# Altium schematic symbol library 13-Logicold 逻辑 IC.SchLib: 297 symbols (part 5 of 30) (continued)
## ATMEGA128A-MU
designator IC?
8-bit AVR Microcontroller, 2.7-5.5V, 16MHz, 128KB Flash, 4KB EEPROM, 4KB SRAM, 64-pin MLF, Industrial Grade (-40°C to 85°C)
pins: 1 ~{PEN} (in), 2 PE0 RXD0/(PDI) (io), 3 PE1 (TXD0/PDO) (io), 4 PE2 (XCK0/AIN0) (io), 5 PE3 (OC3A/AIN1) (io), 6 PE4 (OC3B/INT4) (io), 7 PE5 (OC3C/INT5) (io), 8 PE6 (T3/INT6) (io), 9 PE7 (ICP3/INT7) (io), 10 PB0 (~{SS}) (io), 11 PB1 (SCK) (io), 12 PB2 (MOSI) (io), 13 PB3 (MISO) (io), 14 PB4 (OC0) (io), 15 PB5 (OC1A) (io), 16 PB6 (OC1B) (io), 17 PB7 (OC2/OC1C) (io), 18 PG3/TOSC2 (io), 19 PG4/TOSC1 (io), 20 ~{RESET} (in), 21 VCC (power), 22 GND (power), 23 XTAL2 (out), 24 XTAL1 (in), 25 PD0 (SCL/INT0) (io), 26 PD1 (SDA/INT1) (io), 27 PD2 (RXD1/INT2) (io), 28 PD3 (TXD1/INT3) (io), 29 PD4 (ICP1) (io), 30 PD5 (XCK1) (io), 31 PD6 (T1) (io), 32 PD7 (T2) (io), 33 PG0 (~{WR}) (io), 34 PG1 (~{RD}) (io), 35 PC0 (A8) (io), 36 PC1 (A9) (io), 37 PC2 (A10 (io), 38 PC3 (A11) (io), 39 PC4 (A12) (io), 40 PC5 (A13) (io), 41 PC6 (A14) (io), 42 PC7 (A15) (io), 43 PG2 (ALE) (io), 44 PA7 (AD7) (io), 45 PA6 (AD6) (io), 46 PA5 (AD5) (io), 47 PA4 (AD4) (io), 48 PA3 (AD3) (io), 49 PA2 (AD2) (io), 50 PA1 (AD1) (io), 51 PA0 (AD0) (io), 52 VCC (power), 53 GND (power), 54 PF7 (ADC7/TDI) (io), 55 PF6 (ADC6/TDO) (io), 56 PF5 (ADC5/TMS) (io), 57 PF4 (ADC4/TCK) (io), 58 PF3 (ADC3) (io), 59 PF2 (ADC2) (io), 60 PF1 (ADC1) (io), 61 PF0 (ADC0) (io), 62 AREF (power), 63 GND (power), 64 AVCC (power), 65 EP

## ATMEGA328P-MU
designator IC?
8-bit AVR 20MHz Microcontroller With 32K Bytes In-System  Programmable  Flash
pins: 1 PD3 (PCINT19/OC2B/INT1) (io), 2 PD4 (PCINT20/XCK/T0) (io), 3 GND (power), 4 VCC (power), 5 GND (power), 6 VCC (power), 7 PB6 (PCINT6/XTAL1/TOSC1) (io), 8 PB7 (PCINT7/XTAL2/TOSC2) (io), 9 PD5 (PCINT21/OC0B/T1) (io), 10 PD6 (PCINT22/OC0A/AIN0) (io), 11 PD7 (PCINT23/AIN1) (io), 12 PB0 (PCINT0/CLKO/ICP1) (io), 13 PB1 (PCINT1/OC1A) (io), 14 PB2 (PCINT2/SS/OC1B) (io), 15 PB3 (PCINT3/OC2A/MOSI) (io), 16 PB4 (PCINT4/MISO) (io), 17 PB5 (SCK/PCINT5) (io), 18 AVCC (power), 19 ADC6 (io), 20 AREF (in), 21 GND (power), 22 ADC7 (io), 23 PC0 (ADC0/PCINT8) (io), 24 PC1 (ADC1/PCINT9) (io), 25 PC2 (ADC2/PCINT10) (io), 26 PC3 (ADC3/PCINT11) (io), 27 PC4 (ADC4/SDA/PCINT12) (io), 28 PC5 (ADC5/SCL/PCINT13) (io), 29 PC6 (RESET/PCINT14) (io), 30 PD0 (RXD/PCINT16) (io), 31 PD1 (TXD/PCINT17) (io), 32 PD2 (INT0/PCINT18) (io), 33 EP (power)

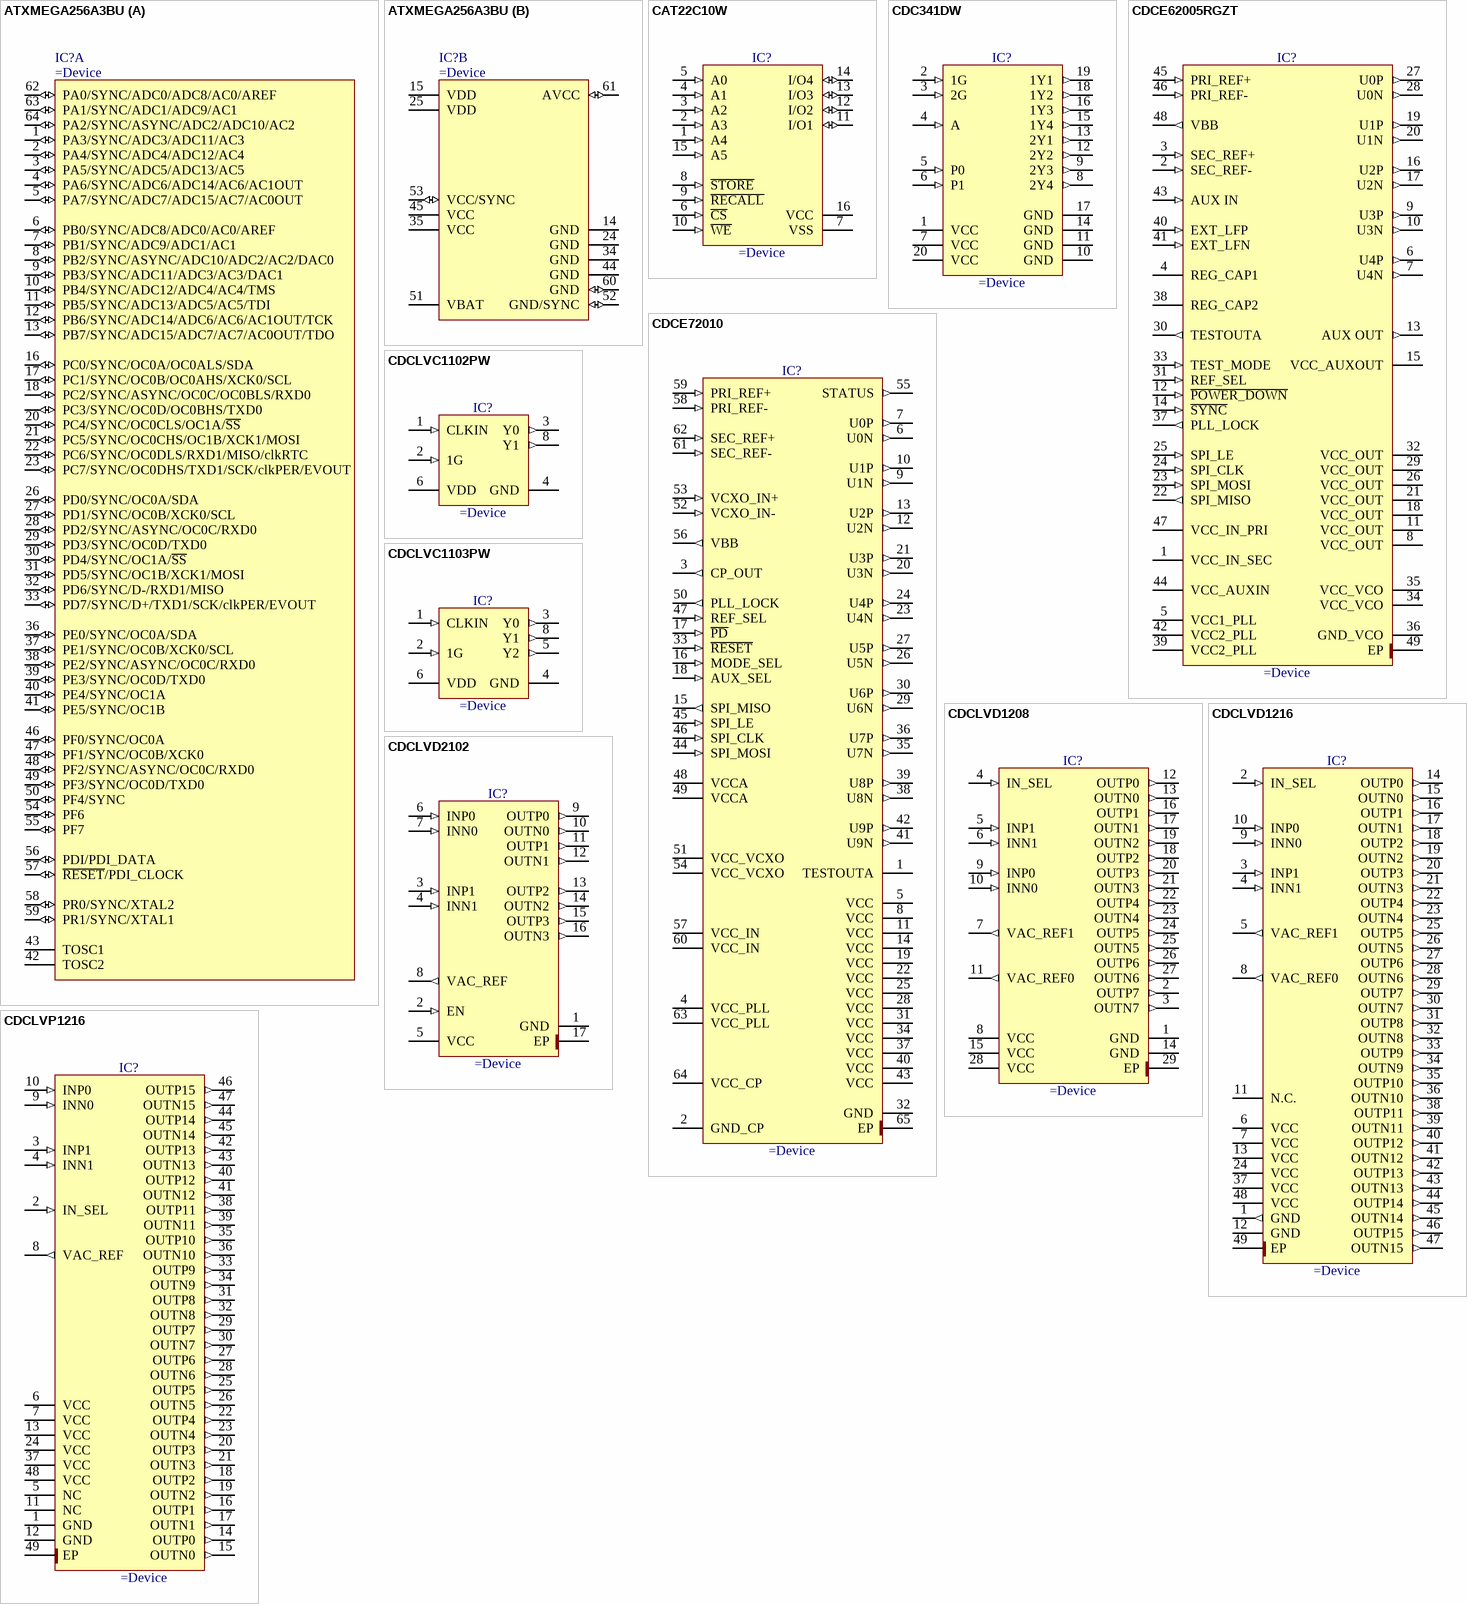
[diagram p30: symbols ATXMEGA256A3BU to CDCLVP1216]

## ATXMEGA256A3BU
designator IC?
8/16-bit XMEGA A3BU 32MHz Microcontroller With 256KBytes of in-System Self-Programmable Flash
part A pins: 1 PA3/SYNC/ADC3/ADC11/AC3 (io), 2 PA4/SYNC/ADC4/ADC12/AC4 (io), 3 PA5/SYNC/ADC5/ADC13/AC5 (io), 4 PA6/SYNC/ADC6/ADC14/AC6/AC1OUT (io), 5 PA7/SYNC/ADC7/ADC15/AC7/AC0OUT (io), 6 PB0/SYNC/ADC8/ADC0/AC0/AREF (io), 7 PB1/SYNC/ADC9/ADC1/AC1 (io), 8 PB2/SYNC/ASYNC/ADC10/ADC2/AC2/DAC0 (io), 9 PB3/SYNC/ADC11/ADC3/AC3/DAC1 (io), 10 PB4/SYNC/ADC12/ADC4/AC4/TMS (io), 11 PB5/SYNC/ADC13/ADC5/AC5/TDI (io), 12 PB6/SYNC/ADC14/ADC6/AC6/AC1OUT/TCK (io), 13 PB7/SYNC/ADC15/ADC7/AC7/AC0OUT/TDO (io), 16 PC0/SYNC/OC0A/OC0ALS/SDA (io), 17 PC1/SYNC/OC0B/OC0AHS/XCK0/SCL (io), 18 PC2/SYNC/ASYNC/OC0C/OC0BLS/RXD0 (io), 19 PC3/SYNC/OC0D/OC0BHS/TXD0 (io), 20 PC4/SYNC/OC0CLS/OC1A/~{SS} (io), 21 PC5/SYNC/OC0CHS/OC1B/XCK1/MOSI (io), 22 PC6/SYNC/OC0DLS/RXD1/MISO/clkRTC (io), 23 PC7/SYNC/OC0DHS/TXD1/SCK/clkPER/EVOUT (io), 26 PD0/SYNC/OC0A/SDA (io), 27 PD1/SYNC/OC0B/XCK0/SCL (io), 28 PD2/SYNC/ASYNC/OC0C/RXD0 (io), 29 PD3/SYNC/OC0D/TXD0 (io), 30 PD4/SYNC/OC1A/~{SS} (io), 31 PD5/SYNC/OC1B/XCK1/MOSI (io), 32 PD6/SYNC/D-/RXD1/MISO (io), 33 PD7/SYNC/D+/TXD1/SCK/clkPER/EVOUT (io), 36 PE0/SYNC/OC0A/SDA (io), 37 PE1/SYNC/OC0B/XCK0/SCL (io), 38 PE2/SYNC/ASYNC/OC0C/RXD0 (io), 39 PE3/SYNC/OC0D/TXD0 (io), 40 PE4/SYNC/OC1A (io), 41 PE5/SYNC/OC1B (io), 42 TOSC2, 43 TOSC1, 46 PF0/SYNC/OC0A (io), 47 PF1/SYNC/OC0B/XCK0 (io), 48 PF2/SYNC/ASYNC/OC0C/RXD0 (io), 49 PF3/SYNC/OC0D/TXD0 (io), 50 PF4/SYNC (io), 54 PF6 (io), 55 PF7 (io), 56 PDI/PDI_DATA (io), 57 ~{RESET}/PDI_CLOCK (io), 58 PR0/SYNC/XTAL2 (io), 59 PR1/SYNC/XTAL1 (io), 62 PA0/SYNC/ADC0/ADC8/AC0/AREF (io), 63 PA1/SYNC/ADC1/ADC9/AC1 (io), 64 PA2/SYNC/ASYNC/ADC2/ADC10/AC2 (io)
part B pins: 14 GND (power), 15 VDD (power), 24 GND (power), 25 VDD (power), 34 GND (power), 35 VCC (power), 44 GND (power), 45 VCC (power), 51 VBAT (power), 52 GND/SYNC (io), 53 VCC/SYNC (io), 60 GND (io), 61 AVCC (io)

## CAT22C10W
designator IC?
256 bit NV CMOS Static RAM
pins: 1 A4 (in), 2 A3 (in), 3 A2 (in), 4 A1 (in), 5 A0 (in), 6 ~{CS} (in), 7 VSS (power), 8 ~{STORE} (in), 9 ~{RECALL} (in), 10 ~{WE} (in), 11 I/O1 (io), 12 I/O2 (io), 13 I/O3 (io), 14 I/O4 (io), 15 A5 (in), 16 VCC (power)

## CDC341DW
designator IC?
1-Line to 8-Line Clock Buffer
pins: 1 VCC (power), 2 1G (in), 3 2G (in), 4 A (in), 5 P0 (in), 6 P1 (in), 7 VCC (power), 8 2Y4 (out), 9 2Y3 (out), 10 GND (power), 11 GND (power), 12 2Y2 (out), 13 2Y1 (out), 14 GND (power), 15 1Y4 (out), 16 1Y3 (out), 17 GND (power), 18 1Y2 (out), 19 1Y1 (out), 20 VCC (power)

## CDCE62005RGZT
designator IC?
5/10 Outputs Clock Generator/Jitter Cleaner with Integrated Dual VCO
pins: 1 VCC_IN_SEC (power), 2 SEC_REF- (in), 3 SEC_REF+ (in), 4 REG_CAP1, 5 VCC1_PLL (power), 6 U4P (out), 7 U4N (out), 8 VCC_OUT (power), 9 U3P (out), 10 U3N (out), 11 VCC_OUT (power), 12 ~{POWER_DOWN} (in), 13 AUX OUT (out), 14 ~{SYNC} (in), 15 VCC_AUXOUT (power), 16 U2P (out), 17 U2N (out), 18 VCC_OUT (power), 19 U1P (out), 20 U1N (out), 21 VCC_OUT (power), 22 SPI_MISO (out), 23 SPI_MOSI (in), 24 SPI_CLK (in), 25 SPI_LE (in), 26 VCC_OUT (power), 27 U0P (out), 28 U0N (out), 29 VCC_OUT (power), 30 TESTOUTA (out), 31 REF_SEL (in), 32 VCC_OUT (power), 33 TEST_MODE (in), 34 VCC_VCO (power), 35 VCC_VCO (power), 36 GND_VCO (power), 37 PLL_LOCK (out), 38 REG_CAP2, 39 VCC2_PLL (power), 40 EXT_LFP (in), 41 EXT_LFN (in), 42 VCC2_PLL (power), 43 AUX IN (in), 44 VCC_AUXIN (power), 45 PRI_REF+ (in), 46 PRI_REF- (in), 47 VCC_IN_PRI (power), 48 VBB (out), 49 EP (power)

## CDCE72010
designator IC?
Ten Output High Performance Clock Synchronizer, Jitter Cleaner, and Clock Distributor
pins: 1 TESTOUTA, 2 GND_CP (power), 3 CP_OUT (out), 4 VCC_PLL (power), 5 VCC (power), 6 U0N (out), 7 U0P (out), 8 VCC (power), 9 U1N (out), 10 U1P (out), 11 VCC (power), 12 U2N (out), 13 U2P (out), 14 VCC (power), 15 SPI_MISO (out), 16 MODE_SEL (in), 17 ~{PD} (in), 18 AUX_SEL (in), 19 VCC (power), 20 U3N (out), 21 U3P (out), 22 VCC (power), 23 U4N (out), 24 U4P (out), 25 VCC (power), 26 U5N (out), 27 U5P (out), 28 VCC (power), 29 U6N (out), 30 U6P (out), 31 VCC (power), 32 GND (power), 33 ~{RESET} (in), 34 VCC (power), 35 U7N (out), 36 U7P (out), 37 VCC (power), 38 U8N (out), 39 U8P (out), 40 VCC (power), 41 U9N (out), 42 U9P (out), 43 VCC (power), 44 SPI_MOSI (in), 45 SPI_LE (in), 46 SPI_CLK (in), 47 REF_SEL (in), 48 VCCA (power), 49 VCCA (power), 50 PLL_LOCK (out), 51 VCC_VCXO (power), 52 VCXO_IN- (in), 53 VCXO_IN+ (in), 54 VCC_VCXO (power), 55 STATUS (out), 56 VBB (out), 57 VCC_IN (power), 58 PRI_REF- (in), 59 PRI_REF+ (in), 60 VCC_IN (power), 61 SEC_REF- (in), 62 SEC_REF+ (in), 63 VCC_PLL (power), 64 VCC_CP (power), 65 EP (power)

## CDCLVC1102PW
designator IC?
3.3 V and 2.5 V LVCMOS 1:2  High-Performance Clock Buffer
pins: 1 CLKIN (in), 2 1G (in), 3 Y0 (out), 4 GND (power), 6 VDD (power), 8 Y1 (out)

## CDCLVC1103PW
designator IC?
3.3 V and 2.5 V LVCMOS 1:2 High-Performance Clock Buffer
pins: 1 CLKIN (in), 2 1G (in), 3 Y0 (out), 4 GND (power), 5 Y2 (out), 6 VDD (power), 8 Y1 (out)

## CDCLVD1208
designator IC?
2:8 Low Additive Jitter LVDS Buffer
pins: 1 GND (power), 2 OUTP7 (out), 3 OUTN7 (out), 4 IN_SEL (in), 5 INP1 (in), 6 INN1 (in), 7 VAC_REF1 (out), 8 VCC (power), 9 INP0 (in), 10 INN0 (in), 11 VAC_REF0 (out), 12 OUTP0 (out), 13 OUTN0 (out), 14 GND (power), 15 VCC (power), 16 OUTP1 (out), 17 OUTN1 (out), 18 OUTP2 (out), 19 OUTN2 (out), 20 OUTP3 (out), 21 OUTN3 (out), 22 OUTP4 (out), 23 OUTN4 (out), 24 OUTP5 (out), 25 OUTN5 (out), 26 OUTP6 (out), 27 OUTN6 (out), 28 VCC (power), 29 EP (power)

## CDCLVD1216
designator IC?
2:16 Low Additive Jitter LVDS Buffer
pins: 1 GND (out), 2 IN_SEL (in), 3 INP1 (in), 4 INN1 (in), 5 VAC_REF1 (out), 6 VCC (power), 7 VCC (power), 8 VAC_REF0 (out), 9 INN0 (in), 10 INP0 (in), 11 N.C., 12 GND (power), 13 VCC (power), 14 OUTP0 (out), 15 OUTN0 (out), 16 OUTP1 (out), 17 OUTN1 (out), 18 OUTP2 (out), 19 OUTN2 (out), 20 OUTP3 (out), 21 OUTN3 (out), 22 OUTP4 (out), 23 OUTN4 (out), 24 VCC (power), 25 OUTP5 (out), 26 OUTN5 (out), 27 OUTP6 (out), 28 OUTN6 (out), 29 OUTP7 (out), 30 OUTN7 (out), 31 OUTP8 (out), 32 OUTN8 (out), 33 OUTP9 (out), 34 OUTN9 (out), 35 OUTP10 (out), 36 OUTN10 (out), 37 VCC (power), 38 OUTP11 (out), 39 OUTN11 (out), 40 OUTP12 (out), 41 OUTN12 (out), 42 OUTP13 (out), 43 OUTN13 (out), 44 OUTP14 (out), 45 OUTN14 (out), 46 OUTP15 (out), 47 OUTN15 (out), 48 VCC (power), 49 EP (power)

## CDCLVD2102
designator IC?
Dual 1:2 Low Additive Jitter LVDS Buffer
pins: 1 GND (power), 2 EN (in), 3 INP1 (in), 4 INN1 (in), 5 VCC (power), 6 INP0 (in), 7 INN0 (in), 8 VAC_REF (out), 9 OUTP0 (out), 10 OUTN0 (out), 11 OUTP1 (out), 12 OUTN1 (out), 13 OUTP2 (out), 14 OUTN2 (out), 15 OUTP3 (out), 16 OUTN3 (out), 17 EP (power)

## CDCLVP1216
designator IC?
Low Jitter, 2-Input Selectable 1:16 Universal-to-LVPECL Buffer
pins: 1 GND (power), 2 IN_SEL (in), 3 INP1 (in), 4 INN1 (in), 5 NC, 6 VCC (power), 7 VCC (power), 8 VAC_REF (out), 9 INN0 (in), 10 INP0 (in), 11 NC, 12 GND (power), 13 VCC (power), 14 OUTP0 (out), 15 OUTN0 (out), 16 OUTP1 (out), 17 OUTN1 (out), 18 OUTP2 (out), 19 OUTN2 (out), 20 OUTP3 (out), 21 OUTN3 (out), 22 OUTP4 (out), 23 OUTN4 (out), 24 VCC (power), 25 OUTP5 (out), 26 OUTN5 (out), 27 OUTP6 (out), 28 OUTN6 (out), 29 OUTP7 (out), 30 OUTN7 (out), 31 OUTP8 (out), 32 OUTN8 (out), 33 OUTP9 (out), 34 OUTN9 (out), 35 OUTP10 (out), 36 OUTN10 (out), 37 VCC (power), 38 OUTP11 (out), 39 OUTN11 (out), 40 OUTP12 (out), 41 OUTN12 (out), 42 OUTP13 (out), 43 OUTN13 (out), 44 OUTP14 (out), 45 OUTN14 (out), 46 OUTP15 (out), 47 OUTN15 (out), 48 VCC (power), 49 EP (power)

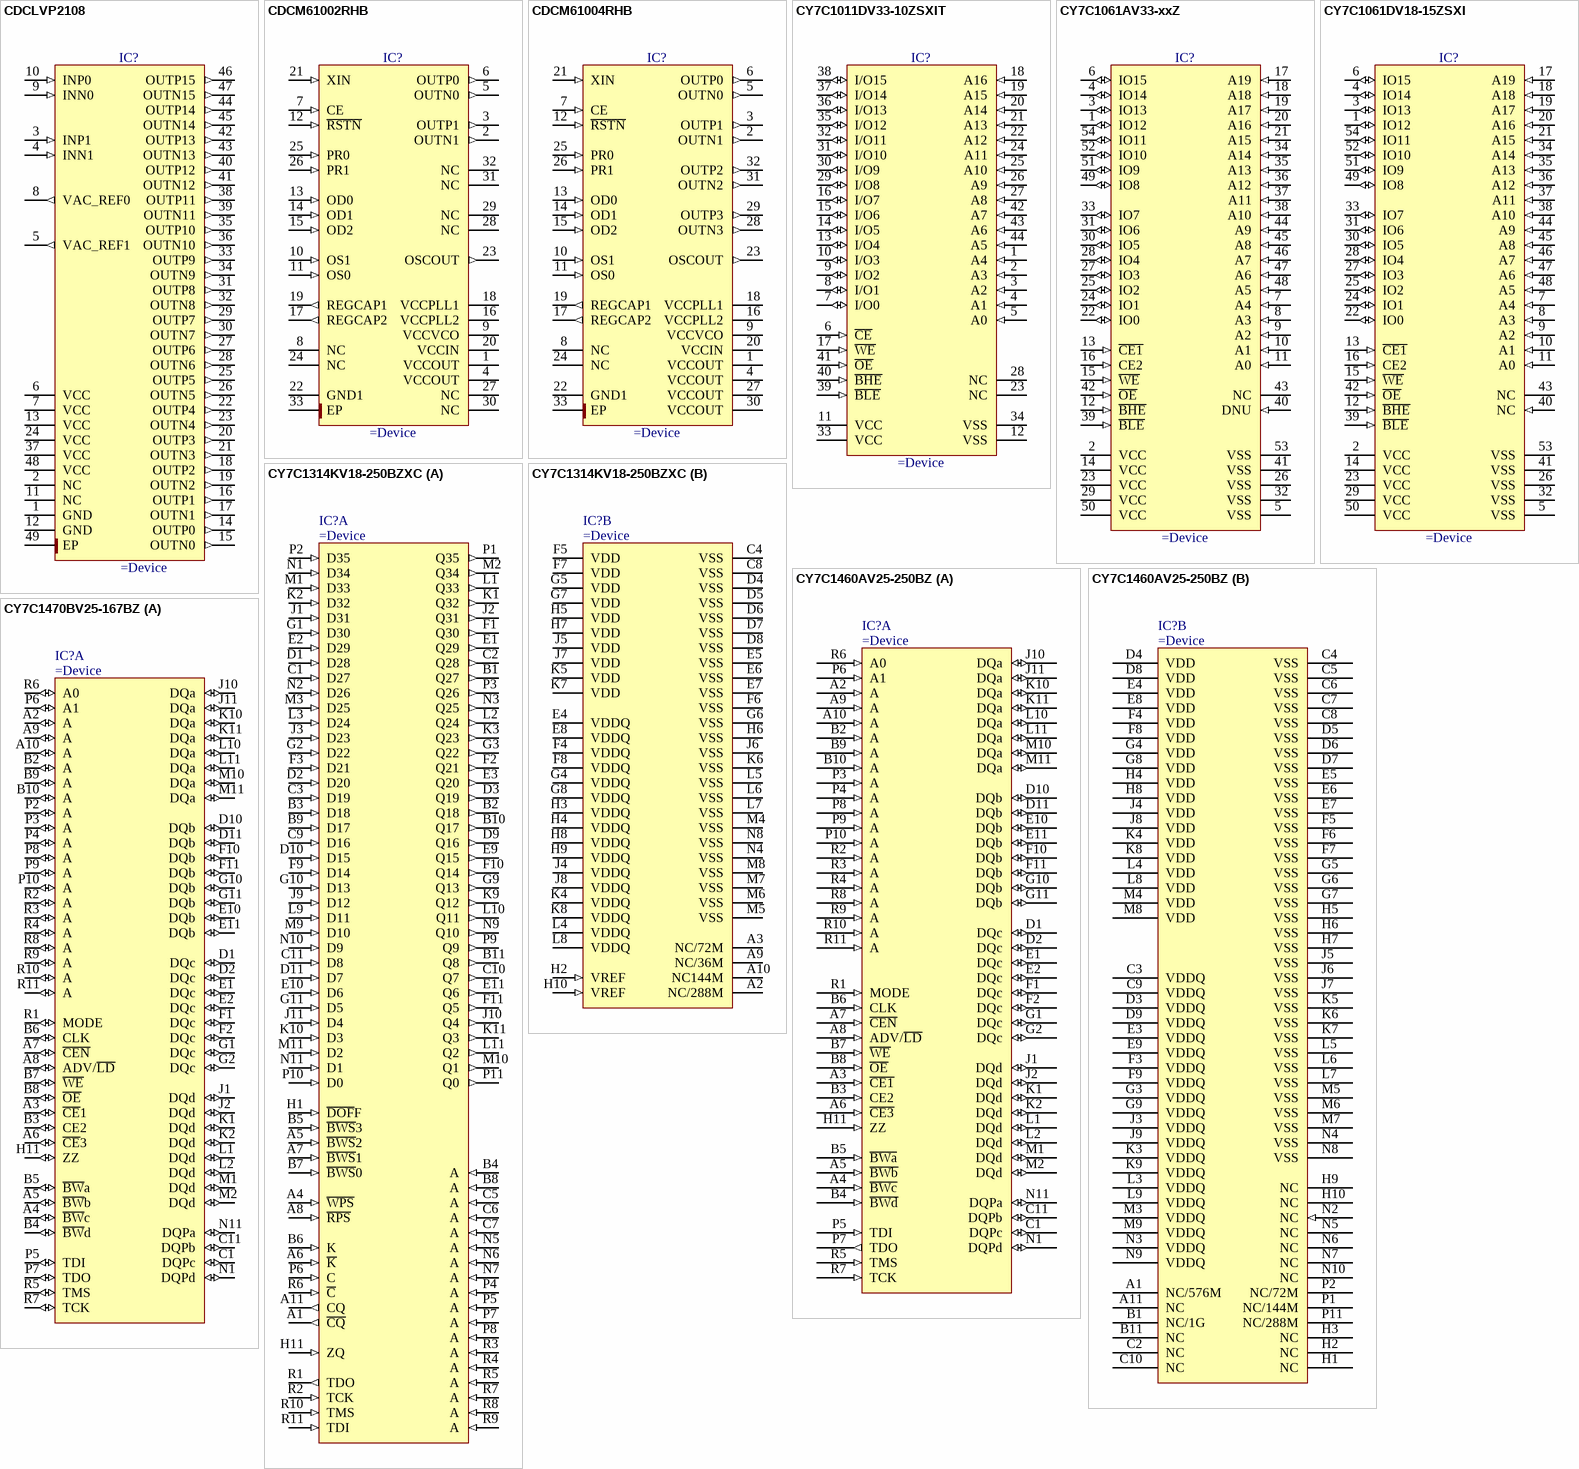
[diagram p31: symbols CDCLVP2108 to CY7C1470BV25-167BZ]

## CDCLVP2108
designator IC?
16 LVPECL Output, High-Performance Clock Buffer
pins: 1 GND (power), 2 NC, 3 INP1 (in), 4 INN1 (in), 5 VAC_REF1 (out), 6 VCC (power), 7 VCC (power), 8 VAC_REF0 (out), 9 INN0 (in), 10 INP0 (in), 11 NC, 12 GND (power), 13 VCC (power), 14 OUTP0 (out), 15 OUTN0 (out), 16 OUTP1 (out), 17 OUTN1 (out), 18 OUTP2 (out), 19 OUTN2 (out), 20 OUTP3 (out), 21 OUTN3 (out), 22 OUTP4 (out), 23 OUTN4 (out), 24 VCC (power), 25 OUTP5 (out), 26 OUTN5 (out), 27 OUTP6 (out), 28 OUTN6 (out), 29 OUTP7 (out), 30 OUTN7 (out), 31 OUTP8 (out), 32 OUTN8 (out), 33 OUTP9 (out), 34 OUTN9 (out), 35 OUTP10 (out), 36 OUTN10 (out), 37 VCC (power), 38 OUTP11 (out), 39 OUTN11 (out), 40 OUTP12 (out), 41 OUTN12 (out), 42 OUTP13 (out), 43 OUTN13 (out), 44 OUTP14 (out), 45 OUTN14 (out), 46 OUTP15 (out), 47 OUTN15 (out), 48 VCC (power), 49 EP (power)

## CDCM61002RHB
designator IC?
Two Output, Integrated VCO, Low-Jitter Clock Generator
pins: 1 VCCOUT (power), 2 OUTN1 (out), 3 OUTP1 (out), 4 VCCOUT (power), 5 OUTN0 (out), 6 OUTP0 (out), 7 CE (in), 8 NC, 9 VCCVCO (power), 10 OS1 (in), 11 OS0 (in), 12 ~{RSTN} (in), 13 OD0 (in), 14 OD1 (in), 15 OD2 (in), 16 VCCPLL2 (power), 17 REGCAP2 (out), 18 VCCPLL1 (power), 19 REGCAP1 (out), 20 VCCIN (power), 21 XIN (in), 22 GND1 (power), 23 OSCOUT (out), 24 NC, 25 PR0 (in), 26 PR1 (in), 27 NC, 28 NC, 29 NC, 30 NC, 31 NC, 32 NC, 33 EP (power)